# Altium integrated library BS_Altium_Lib.IntLib: 1016 symbols (part 7 of 8) (continued)
## GRM188R61C474KA93D (continued)
CAP CER 0.47UF 16V X5R 0603; Manufacturer: Murata Electronics North America; Manufacturer Part Number: GRM188R61C474KA93D; Tolerance: ±10%; Supplier 1: Digi-Key; Supplier Part Number 1: 490-11501-1-ND; RoHS: RoHS Compliant; Category: Capacitors; Stock 1: 6697; Pricing 1: 1=0.19, 10=0.131, 25=0.0964, 50=0.0788, 100=0.0666, 250=0.05428, 500=0.04554, 1000=0.04028 (USD); Packaging: Cut Tape (CT); Part Status: Active; Capacitance: 0.47µF; Voltage - Rated: 16V; Temperature Coefficient: X5R; Operating Temperature: -55°C ~ 85°C; Features: -; Ratings: -; Applications: General Purpose; Mounting Type: Surface Mount, MLCC; Size / Dimension: 0.063" L x 0.031" W (1.60mm x 0.80mm); Height - Seated (Max): -; Thickness (Max): 0.035" (0.90mm); Lead Spacing: -; Lead Style: -; ComponentLink1URL: http://www.murata.com/~/media/webrenewal/support/library/catalog/products/capacitor/mlcc/c02e.ashx; ComponentLink1Description: http://www.murata.com/~/media/webrenewal/support/library/catalog/products/capacitor/mlcc/c02e.ashx
footprint C 0603 (Chip Capacitor, 2-Leads, Body 1.6x0.8mm, IPC Medium Density)
pins: 1, 2

## GRM188R61C475KAAJD
designator C?, comment 4.7µF  Package: 0603
CAP CER 4.7UF 16V X5R 0603; Manufacturer: Murata Electronics North America; Manufacturer Part Number: GRM188R61C475KAAJD; Tolerance: ±10%; Supplier 1: Digi-Key; Supplier Part Number 1: 490-10481-1-ND; RoHS: RoHS Compliant; Category: Capacitors; Stock 1: 167381; Pricing 1: 1=0.33, 10=0.227, 25=0.182, 50=0.1516, 100=0.1289, 250=0.10236, 500=0.091, 1000=0.07962 (USD); Packaging: Cut Tape (CT); Part Status: Active; Capacitance: 4.7µF; Voltage - Rated: 16V; Temperature Coefficient: X5R; Operating Temperature: -55°C ~ 85°C; Features: Derating Recommended; Ratings: -; Applications: General Purpose; Mounting Type: Surface Mount, MLCC; Size / Dimension: 0.063" L x 0.031" W (1.60mm x 0.80mm); Height - Seated (Max): -; Thickness (Max): 0.037" (0.95mm); Lead Spacing: -; Lead Style: -; ComponentLink1URL: http://www.murata.com/~/media/webrenewal/support/library/catalog/products/capacitor/mlcc/c02e.ashx; ComponentLink1Description: http://www.murata.com/~/media/webrenewal/support/library/catalog/products/capacitor/mlcc/c02e.ashx
footprint C 0603 (Chip Capacitor, 2-Leads, Body 1.6x0.8mm, IPC Medium Density)
pins: 1, 2

## GRM188R61E105KA12D
designator C?, comment 1µF  Package: 0603
CAP CER 1UF 25V X5R 0603; Manufacturer: Murata Electronics North America; Manufacturer Part Number: GRM188R61E105KA12D; Tolerance: ±10%; Supplier 1: Digi-Key; Supplier Part Number 1: 490-3897-1-ND; RoHS: RoHS Compliant; Category: Capacitors; Stock 1: 3125603; Pricing 1: 1=0.1, 10=0.04, 25=0.0288, 50=0.0218, 100=0.0178, 250=0.01484, 500=0.01268, 1000=0.00996 (USD); Packaging: Cut Tape (CT); Part Status: Active; Capacitance: 1µF; Voltage - Rated: 25V; Temperature Coefficient: X5R; Operating Temperature: -55°C ~ 85°C; Features: -; Ratings: -; Applications: General Purpose; Mounting Type: Surface Mount, MLCC; Size / Dimension: 0.063" L x 0.031" W (1.60mm x 0.80mm); Height - Seated (Max): -; Thickness (Max): 0.035" (0.90mm); Lead Spacing: -; Lead Style: -; ComponentLink1URL: http://www.murata.com/~/media/webrenewal/support/library/catalog/products/capacitor/mlcc/c02e.ashx; ComponentLink1Description: http://www.murata.com/~/media/webrenewal/support/library/catalog/products/capacitor/mlcc/c02e.ashx
footprint C 0603 (Chip Capacitor, 2-Leads, Body 1.6x0.8mm, IPC Medium Density)
pins: 1, 2

## GRM188R61E224KA88D
designator C?, comment 0.22µF  Package: 0603
CAP CER 0.22UF 25V X5R 0603; Manufacturer: Murata Electronics North America; Manufacturer Part Number: GRM188R61E224KA88D; Tolerance: ±10%; Supplier 1: Digi-Key; Supplier Part Number 1: 490-11502-1-ND; RoHS: RoHS Compliant; Category: Capacitors; Stock 1: 3706; Pricing 1: 1=0.18, 10=0.126, 25=0.0924, 50=0.0756, 100=0.0638, 250=0.05204, 500=0.04366, 1000=0.03862 (USD); Packaging: Cut Tape (CT); Part Status: Active; Capacitance: 0.22µF; Voltage - Rated: 25V; Temperature Coefficient: X5R; Operating Temperature: -55°C ~ 85°C; Features: -; Ratings: -; Applications: General Purpose; Mounting Type: Surface Mount, MLCC; Size / Dimension: 0.063" L x 0.031" W (1.60mm x 0.80mm); Height - Seated (Max): -; Thickness (Max): 0.035" (0.90mm); Lead Spacing: -; Lead Style: -; ComponentLink1URL: http://www.murata.com/~/media/webrenewal/support/library/catalog/products/capacitor/mlcc/c02e.ashx; ComponentLink1Description: http://www.murata.com/~/media/webrenewal/support/library/catalog/products/capacitor/mlcc/c02e.ashx
footprint C 0603 (Chip Capacitor, 2-Leads, Body 1.6x0.8mm, IPC Medium Density)
pins: 1, 2

## GRM188R61E225KA12D
designator C?, comment 2.2µF  Package: 0603
CAP CER 2.2UF 25V X5R 0603; Manufacturer: Murata Electronics North America; Manufacturer Part Number: GRM188R61E225KA12D; Tolerance: ±10%; Supplier 1: Digi-Key; Supplier Part Number 1: 490-10731-1-ND; RoHS: RoHS Compliant; Category: Capacitors; Stock 1: 174226; Pricing 1: 1=0.15, 10=0.109, 25=0.08, 50=0.0622, 100=0.0515, 250=0.0426, 500=0.0361, 1000=0.02988 (USD); Packaging: Cut Tape (CT); Part Status: Active; Capacitance: 2.2µF; Voltage - Rated: 25V; Temperature Coefficient: X5R; Operating Temperature: -55°C ~ 85°C; Features: -; Ratings: -; Applications: General Purpose; Mounting Type: Surface Mount, MLCC; Size / Dimension: 0.063" L x 0.031" W (1.60mm x 0.80mm); Height - Seated (Max): -; Thickness (Max): 0.035" (0.90mm); Lead Spacing: -; Lead Style: -; ComponentLink1URL: http://www.murata.com/~/media/webrenewal/support/library/catalog/products/capacitor/mlcc/c02e.ashx; ComponentLink1Description: http://www.murata.com/~/media/webrenewal/support/library/catalog/products/capacitor/mlcc/c02e.ashx
footprint C 0603 (Chip Capacitor, 2-Leads, Body 1.6x0.8mm, IPC Medium Density)
pins: 1, 2

## GRM188R61E474KA12D
designator C?, comment 0.47µF  Package: 0603
CAP CER 0.47UF 25V X5R 0603; Manufacturer: Murata Electronics North America; Manufacturer Part Number: GRM188R61E474KA12D; Tolerance: ±10%; Supplier 1: Digi-Key; Supplier Part Number 1: 490-9728-1-ND; RoHS: RoHS Compliant; Category: Capacitors; Stock 1: 6941; Pricing 1: 1=0.22, 10=0.147, 25=0.1076, 50=0.088, 100=0.0743, 250=0.06064, 500=0.05086, 1000=0.04499 (USD); Packaging: Cut Tape (CT); Part Status: Active; Capacitance: 0.47µF; Voltage - Rated: 25V; Temperature Coefficient: X5R; Operating Temperature: -55°C ~ 85°C; Features: -; Ratings: -; Applications: General Purpose; Mounting Type: Surface Mount, MLCC; Size / Dimension: 0.063" L x 0.031" W (1.60mm x 0.80mm); Height - Seated (Max): -; Thickness (Max): 0.035" (0.90mm); Lead Spacing: -; Lead Style: -; ComponentLink1URL: http://www.murata.com/~/media/webrenewal/support/library/catalog/products/capacitor/mlcc/c02e.ashx; ComponentLink1Description: http://www.murata.com/~/media/webrenewal/support/library/catalog/products/capacitor/mlcc/c02e.ashx
footprint C 0603 (Chip Capacitor, 2-Leads, Body 1.6x0.8mm, IPC Medium Density)
pins: 1, 2

## GRM188R61E475KE11D
designator C?, comment 4.7µF  Package: 0603
CAP CER 4.7UF 25V X5R 0603; Manufacturer: Murata Electronics North America; Manufacturer Part Number: GRM188R61E475KE11D; Tolerance: ±10%; Supplier 1: Digi-Key; Supplier Part Number 1: 490-7203-1-ND; RoHS: RoHS Compliant; Category: Capacitors; Stock 1: 3914; Pricing 1: 1=0.35, 10=0.242, 25=0.198, 50=0.169, 100=0.1449, 250=0.12076, 500=0.10868, 1000=0.09177 (USD); Packaging: Cut Tape (CT); Part Status: Active; Capacitance: 4.7µF; Voltage - Rated: 25V; Temperature Coefficient: X5R; Operating Temperature: -55°C ~ 85°C; Features: -; Ratings: -; Applications: General Purpose; Mounting Type: Surface Mount, MLCC; Size / Dimension: 0.063" L x 0.031" W (1.60mm x 0.80mm); Height - Seated (Max): -; Thickness (Max): 0.031" (0.80mm); Lead Spacing: -; Lead Style: -; ComponentLink1URL: http://www.murata.com/~/media/webrenewal/support/library/catalog/products/capacitor/mlcc/c02e.ashx; ComponentLink1Description: http://www.murata.com/~/media/webrenewal/support/library/catalog/products/capacitor/mlcc/c02e.ashx
footprint C 0603 (Chip Capacitor, 2-Leads, Body 1.6x0.8mm, IPC Medium Density)
pins: 1, 2

## GRM188R71C105KE15D
designator C?, comment 1µF  Package: 0603
CAP CER 1UF 16V X7R 0603; Manufacturer: Murata Electronics North America; Manufacturer Part Number: GRM188R71C105KE15D; Tolerance: ±10%; Supplier 1: Digi-Key; Supplier Part Number 1: 490-10734-1-ND; RoHS: RoHS Compliant; Category: Capacitors; Stock 1: 149197; Pricing 1: 1=0.1, 10=0.034, 50=0.0182, 100=0.0154, 250=0.0126, 500=0.01078, 1000=0.0084 (USD); Packaging: Cut Tape (CT); Part Status: Active; Capacitance: 1µF; Voltage - Rated: 16V; Temperature Coefficient: X7R; Operating Temperature: -55°C ~ 125°C; Features: -; Ratings: -; Applications: General Purpose; Mounting Type: Surface Mount, MLCC; Size / Dimension: 0.063" L x 0.031" W (1.60mm x 0.80mm); Height - Seated (Max): -; Thickness (Max): 0.035" (0.90mm); Lead Spacing: -; Lead Style: -; ComponentLink1URL: http://www.murata.com/~/media/webrenewal/support/library/catalog/products/capacitor/mlcc/c02e.pdf; ComponentLink1Description: http://www.murata.com/~/media/webrenewal/support/library/catalog/products/capacitor/mlcc/c02e.pdf
footprint C 0603 (Chip Capacitor, 2-Leads, Body 1.6x0.8mm, IPC Medium Density)
pins: 1, 2

## GRM188R71E104KA01D
designator C?, comment 0.10µF  Package: 0603
CAP CER 0.1UF 25V X7R 0603; Manufacturer: Murata Electronics North America; Manufacturer Part Number: GRM188R71E104KA01D; Tolerance: ±10%; Supplier 1: Digi-Key; Supplier Part Number 1: 490-1524-1-ND; RoHS: RoHS Compliant; Category: Capacitors; Stock 1: 6118372; Pricing 1: 1=0.1, 10=0.019, 50=0.0104, 100=0.0088, 250=0.0072, 500=0.00616, 1000=0.0048 (USD); Packaging: Cut Tape (CT); Part Status: Active; Capacitance: 0.10µF; Voltage - Rated: 25V; Temperature Coefficient: X7R; Operating Temperature: -55°C ~ 125°C; Features: -; Ratings: -; Applications: General Purpose; Mounting Type: Surface Mount, MLCC; Size / Dimension: 0.063" L x 0.031" W (1.60mm x 0.80mm); Height - Seated (Max): -; Thickness (Max): 0.035" (0.90mm); Lead Spacing: -; Lead Style: -; ComponentLink1URL: http://www.murata.com/~/media/webrenewal/support/library/catalog/products/capacitor/mlcc/c02e.pdf; ComponentLink1Description: http://www.murata.com/~/media/webrenewal/support/library/catalog/products/capacitor/mlcc/c02e.pdf
footprint C 0603 (Chip Capacitor, 2-Leads, Body 1.6x0.8mm, IPC Medium Density)
pins: 1, 2

## GRM188R72A103KA01J
designator C?, comment 0.01 uF  Package: 0603
CAP CER 0.01UF 16V X5R 0603; Manufacturer: Murata Electronics North America; Manufacturer Part Number: GRM188R72A103KA01J; Tolerance: ±10%; Voltage - Rated: 100; Supplier 1: Digi-Key; Supplier Part Number 1: 490-12000-1-ND; RoHS: RoHS Compliant; Category: Capacitors; Stock 1: 2455; Pricing 1: 1=0.110, 10=0.090, 100=0.039, 500=0.028, 1000=0.022, 2500=0.020, 5000=0.019, 10000=0.015, 20000=0.013 (USD); Capacitance: 0.01 uF; Packaging: Cut Tape (CT); ComponentLink1URL: http://www.murata.com/~/media/webrenewal/support/library/catalog/products/capacitor/mlcc/c02e.ashx; ComponentLink1Description: http://www.murata.com/~/media/webrenewal/support/library/catalog/products/capacitor/mlcc/c02e.ashx; Applications: General Purpose; Features: -; Height - Seated (Max): -; Lead Spacing: -; Lead Style: -; Mounting Type: Surface Mount, MLCC; Operating Temperature: -55°C ~ 125°C; Part Status: Active; Ratings: -; Size / Dimension: 0.063" L x 0.031" W (1.60mm x 0.80mm); Temperature Coefficient: X5R; Thickness (Max): 0.031" (0.80mm)
footprint C 0603
pins: 1, 2

## GRM1885C1H100JA01D
designator C?, comment 10pF  Package: 0603
CAP CER 10PF 50V C0G/NP0 0603; Manufacturer: Murata Electronics North America; Manufacturer Part Number: GRM1885C1H100JA01D; Tolerance: ±5%; Temperature Coefficient: C0G, NP0; Supplier 1: Digi-Key; Supplier Part Number 1: 490-1403-1-ND; RoHS: RoHS Compliant; Category: Capacitors; Stock 1: 369990; Pricing 1: 1=0.1, 10=0.071, 100=0.0316, 500=0.0226, 1000=0.01776 (USD); Packaging: Cut Tape (CT); Part Status: Active; Voltage - Rated: 50V; Operating Temperature: -55°C ~ 125°C; Features: -; Ratings: -; Applications: General Purpose; Mounting Type: Surface Mount, MLCC; Size / Dimension: 0.063" L x 0.031" W (1.60mm x 0.80mm); Height - Seated (Max): -; Thickness (Max): 0.035" (0.90mm); Lead Spacing: -; Lead Style: -; ComponentLink1URL: http://www.murata.com/~/media/webrenewal/support/library/catalog/products/capacitor/mlcc/c02e.ashx; ComponentLink1Description: http://www.murata.com/~/media/webrenewal/support/library/catalog/products/capacitor/mlcc/c02e.ashx; Capacitance: 10pF
footprint C 0603 (Chip Capacitor, 2-Leads, Body 1.6x0.8mm, IPC Medium Density)
pins: 1, 2

## GRM1885C1H100JA01J
designator C?, comment 10pF  Package: 0603
CAP CER 10PF 50V C0G/NP0 0603; Manufacturer: Murata Electronics North America; Manufacturer Part Number: GRM1885C1H100JA01J; Tolerance: ±5%; Temperature Coefficient: C0G, NP0; Supplier 1: Digi-Key; Supplier Part Number 1: 490-11434-1-ND; RoHS: RoHS Compliant; Category: Capacitors; Stock 1: 39522; Pricing 1: 1=0.1, 10=0.071, 100=0.0316, 500=0.0226, 1000=0.01776, 2500=0.01614, 5000=0.01485 (USD); Packaging: Cut Tape (CT); Part Status: Active; Voltage - Rated: 50V; Operating Temperature: -55°C ~ 125°C; Features: -; Ratings: -; Applications: General Purpose; Mounting Type: Surface Mount, MLCC; Size / Dimension: 0.063" L x 0.031" W (1.60mm x 0.80mm); Height - Seated (Max): -; Thickness (Max): 0.035" (0.90mm); Lead Spacing: -; Lead Style: -; ComponentLink1URL: http://www.murata.com/~/media/webrenewal/support/library/catalog/products/capacitor/mlcc/c02e.ashx; ComponentLink1Description: http://www.murata.com/~/media/webrenewal/support/library/catalog/products/capacitor/mlcc/c02e.ashx; Capacitance: 10pF
footprint C 0603 (Chip Capacitor, 2-Leads, Body 1.6x0.8mm, IPC Medium Density)
pins: 1, 2

## GRM1885C1H200JA01D
designator C?, comment 20pF  Package: 0603
CAP CER 27PF 50V NP0 0603; Manufacturer: Murata Electronics North America; Manufacturer Part Number: GRM1885C1H200JA01D; Tolerance: ±5%; Temperature Coefficient: C0G, NP0; Supplier 1: Digi-Key; Supplier Part Number 1: 490-1410-2-ND; RoHS: RoHS Compliant; Category: Capacitors; Stock 1: 161874; Pricing 1: 1=0.1, 10=0.061, 50=0.0332, 100=0.0281, 250=0.02296, 500=0.01964, 1000=0.0153 (USD); Packaging: Cut Tape (CT); Part Status: Active; Capacitance: 20pF; Voltage - Rated: 50V; Operating Temperature: -55°C ~ 125°C; Features: -; Ratings: -; Applications: General Purpose; Mounting Type: Surface Mount, MLCC; Size / Dimension: 0.063" L x 0.031" W (1.60mm x 0.80mm); Height - Seated (Max): -; Thickness (Max): 0.035" (0.90mm); Lead Spacing: -; Lead Style: -; ComponentLink1URL: http://www.murata.com/~/media/webrenewal/support/library/catalog/products/capacitor/mlcc/c02e.pdf; ComponentLink1Description: http://www.murata.com/~/media/webrenewal/support/library/catalog/products/capacitor/mlcc/c02e.pdf
footprint C 0603 (Chip Capacitor, 2-Leads, Body 1.6x0.8mm, IPC Medium Density)
pins: 1, 2

## GRM1885C1H270JA01D
designator C?, comment 27pF  Package: 0603
CAP CER 27PF 50V NP0 0603; Manufacturer: Murata Electronics North America; Manufacturer Part Number: GRM1885C1H270JA01D; Tolerance: ±5%; Temperature Coefficient: C0G, NP0; Supplier 1: Digi-Key; Supplier Part Number 1: 490-1413-1-ND; RoHS: RoHS Compliant; Category: Capacitors; Stock 1: 161874; Pricing 1: 1=0.1, 10=0.061, 50=0.0332, 100=0.0281, 250=0.02296, 500=0.01964, 1000=0.0153 (USD); Packaging: Cut Tape (CT); Part Status: Active; Capacitance: 27pF; Voltage - Rated: 50V; Operating Temperature: -55°C ~ 125°C; Features: -; Ratings: -; Applications: General Purpose; Mounting Type: Surface Mount, MLCC; Size / Dimension: 0.063" L x 0.031" W (1.60mm x 0.80mm); Height - Seated (Max): -; Thickness (Max): 0.035" (0.90mm); Lead Spacing: -; Lead Style: -; ComponentLink1URL: http://www.murata.com/~/media/webrenewal/support/library/catalog/products/capacitor/mlcc/c02e.pdf; ComponentLink1Description: http://www.murata.com/~/media/webrenewal/support/library/catalog/products/capacitor/mlcc/c02e.pdf
footprint C 0603 (Chip Capacitor, 2-Leads, Body 1.6x0.8mm, IPC Medium Density)
pins: 1, 2


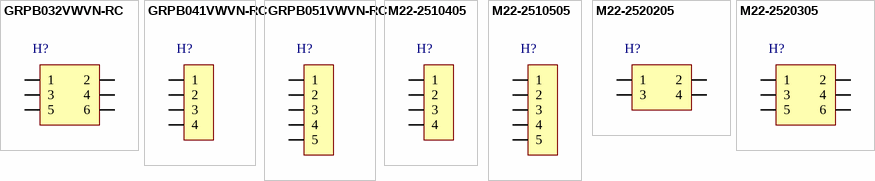
[diagram p40: symbols GRPB032VWVN-RC to M22-2520305]

## GRPB032VWVN-RC
designator H?  (value not drawn)
CONN HEADER .050" 6POS DL PCB AU; Manufacturer: Sullins Connector Solutions; Pitch - Mating: 0.050" (1.27mm); Style: Board to Board or Cable; Shrouding: Unshrouded; Number of Positions: 6; Number of Positions Loaded: All; Contact Length - Mating: 0.118" (3.00mm); Contact Length - Post: 0.091" (2.30mm); Overall Contact Length: 0.248" (6.30mm); Material Flammability Rating: UL94 V-0; Current Rating: 1A; Supplier 1: Digi-Key; Supplier Part Number 1: S9015E-03-ND; Manufacturer Part Number: GRPB032VWVN-RC; RoHS: RoHS Compliant; Category: Connectors, Interconnects; Stock 1: 14221; Pricing 1: 1=0.63, 10=0.49, 25=0.4564, 50=0.415, 100=0.3735, 250=0.3154, 500=0.2988, 1000=0.2656, 2500=0.22078 (USD); Packaging: Bulk; Part Status: Active; Connector Type: Header; Contact Type: Male Pin; Number of Rows: 2; Row Spacing - Mating: 0.050" (1.27mm); Mounting Type: Through Hole; Termination: Solder; Fastening Type: -; Insulation Height: 0.039" (1.00mm); Contact Shape: Square; Contact Finish - Mating: Gold; Contact Finish Thickness - Mating: Flash; Contact Finish - Post: Gold; Contact Material: Brass; Insulation Material: Polyamide (PA9T), Nylon 9T; Features: -; Operating Temperature: -40°C ~ 105°C; Ingress Protection: -; Insulation Color: -; Voltage Rating: -; Mated Stacking Heights: -; Contact Finish Thickness - Post: Flash; Applications: -; ComponentLink1URL: http://media.digikey.com/pdf/Data%20Sheets/Sullins%20PDFs/GRPB_%20_2VWVN-RC%2010954-C.pdf; ComponentLink1Description: http://media.digikey.com/pdf/Data%20Sheets/Sullins%20PDFs/GRPB_%20_2VWVN-RC%2010954-C.pdf
footprint HDR/3/2/MALE/50
pins: 1, 2, 3, 4, 5, 6

## GRPB041VWVN-RC
designator H?  (value not drawn)
CONN HEADER .050" 4POS PCB GOLD; Manufacturer: Sullins Connector Solutions; Pitch - Mating: 0.050" (1.27mm); Style: Board to Board or Cable; Shrouding: Unshrouded; Number of Positions: 4; Number of Positions Loaded: All; Contact Length - Mating: 0.118" (3.00mm); Contact Length - Post: 0.091" (2.30mm); Overall Contact Length: 0.248" (6.30mm); Material Flammability Rating: UL94 V-0; Current Rating: 1A; Supplier 1: Digi-Key; Supplier Part Number 1: S9014E-04-ND; Manufacturer Part Number: GRPB041VWVN-RC; RoHS: RoHS Compliant; Category: Connectors, Interconnects; Stock 1: 29276; Pricing 1: 1=0.56, 10=0.389, 25=0.3332, 50=0.2998, 100=0.2609, 250=0.222, 500=0.2109, 1000=0.1887, 2500=0.14985 (USD); Packaging: Bulk; Part Status: Active; Connector Type: Header; Contact Type: Male Pin; Number of Rows: 1; Row Spacing - Mating: -; Mounting Type: Through Hole; Termination: Solder; Fastening Type: -; Insulation Height: 0.039" (1.00mm); Contact Shape: Square; Contact Finish - Mating: Gold; Contact Finish Thickness - Mating: Flash; Contact Finish - Post: Gold; Contact Material: Brass; Insulation Material: Polyamide (PA9T), Nylon 9T; Features: -; Operating Temperature: -40°C ~ 105°C; Ingress Protection: -; Insulation Color: -; Voltage Rating: -; Mated Stacking Heights: -; Contact Finish Thickness - Post: Flash; Applications: -; ComponentLink1URL: http://www.sullinscorp.com/drawings/71_GRPB___1VWVN-RC,_10957-C.pdf; ComponentLink1Description: http://www.sullinscorp.com/drawings/71_GRPB___1VWVN-RC,_10957-C.pdf
footprint HDR/4x1/MALE/50
pins: 1, 2, 3, 4

## GRPB051VWVN-RC
designator H?  (value not drawn)
CONN HEADER .050" 5POS PCB GOLD; Manufacturer: Sullins Connector Solutions; Pitch - Mating: 0.050" (1.27mm); Style: Board to Board or Cable; Shrouding: Unshrouded; Number of Positions: 5; Number of Positions Loaded: All; Contact Length - Mating: 0.118" (3.00mm); Contact Length - Post: 0.091" (2.30mm); Overall Contact Length: 0.248" (6.30mm); Material Flammability Rating: UL94 V-0; Current Rating: 1A; Supplier 1: Digi-Key; Supplier Part Number 1: S9014E-05-ND; Manufacturer Part Number: GRPB051VWVN-RC; RoHS: RoHS Compliant; Category: Connectors, Interconnects; Stock 1: 17300; Pricing 1: 1=0.52, 10=0.407, 25=0.3796, 50=0.345, 100=0.3105, 250=0.2622, 500=0.2484, 1000=0.2208, 2500=0.18354 (USD); Packaging: Bulk; Part Status: Active; Connector Type: Header; Contact Type: Male Pin; Number of Rows: 1; Row Spacing - Mating: -; Mounting Type: Through Hole; Termination: Solder; Fastening Type: -; Insulation Height: 0.039" (1.00mm); Contact Shape: Square; Contact Finish - Mating: Gold; Contact Finish Thickness - Mating: Flash; Contact Finish - Post: Gold; Contact Material: Brass; Insulation Material: Polyamide (PA9T), Nylon 9T; Features: -; Operating Temperature: -40°C ~ 105°C; Ingress Protection: -; Insulation Color: -; Voltage Rating: -; Mated Stacking Heights: -; Contact Finish Thickness - Post: Flash; Applications: -; ComponentLink1URL: http://www.sullinscorp.com/drawings/71_GRPB___1VWVN-RC,_10957-C.pdf; ComponentLink1Description: http://www.sullinscorp.com/drawings/71_GRPB___1VWVN-RC,_10957-C.pdf
footprint HDR/5x1/MALE/50
pins: 1, 2, 3, 4, 5

## M22-2510405
designator H?  (value not drawn)
CONN HEADER 2MM VERT AU 4POS; Manufacturer: Harwin Inc.; Connector Type: Header, Cuttable; Pitch - Mating: 0.079" (2.00mm); Style: Board to Board; Shrouding: Unshrouded; Number of Positions: 4; Number of Positions Loaded: All; Contact Length - Mating: 0.138" (3.50mm); Contact Length - Post: 0.091" (2.30mm); Overall Contact Length: 0.287" (7.30mm); Material Flammability Rating: UL94 V-0; Current Rating: 1A per Contact; Mated Stacking Heights: 5.9mm, 8.6mm; Supplier 1: Digi-Key; Supplier Part Number 1: 952-1313-ND; Manufacturer Part Number: M22-2510405; RoHS: RoHS Compliant; Category: Connectors, Interconnects; Stock 1: 16900; Pricing 1: 1=0.29, 10=0.273, 100=0.1911, 500=0.1638, 1000=0.1365, 5000=0.117, 10000=0.1092 (USD); Packaging: Bulk; Part Status: Active; Contact Type: Male Pin; Number of Rows: 1; Row Spacing - Mating: -; Mounting Type: Through Hole; Termination: Solder; Fastening Type: -; Insulation Height: 0.060" (1.50mm); Contact Shape: Square; Contact Finish - Mating: Gold; Contact Finish Thickness - Mating: -; Contact Finish - Post: -; Contact Material: Phosphor Bronze; Insulation Material: Polyamide (PA6T), Nylon 6T; Features: -; Operating Temperature: -40°C ~ 105°C; Ingress Protection: -; Insulation Color: Black; Voltage Rating: -; Contact Finish Thickness - Post: -; Applications: -; ComponentLink1URL: https://cdn.harwin.com/pdfs/M22-251.pdf; ComponentLink1Description: https://cdn.harwin.com/pdfs/M22-251.pdf
footprint HDR/4x1/MALE/2.0
pins: 1, 2, 3, 4

## M22-2510505
designator H?  (value not drawn)
CONN HEADER 2MM VERT AU 5POS; Manufacturer: Harwin Inc.; Connector Type: Header, Cuttable; Pitch - Mating: 0.079" (2.00mm); Style: Board to Board; Shrouding: Unshrouded; Number of Positions: 5; Number of Positions Loaded: All; Contact Length - Mating: 0.138" (3.50mm); Contact Length - Post: 0.091" (2.30mm); Overall Contact Length: 0.287" (7.30mm); Material Flammability Rating: UL94 V-0; Current Rating: 1A per Contact; Mated Stacking Heights: 5.9mm, 8.6mm; Supplier 1: Digi-Key; Supplier Part Number 1: 952-1314-ND; Manufacturer Part Number: M22-2510505; RoHS: RoHS Compliant; Category: Connectors, Interconnects; Stock 1: 3876; Pricing 1: 1=0.36, 10=0.336, 100=0.2352, 500=0.2016, 1000=0.168, 5000=0.144, 10000=0.1344 (USD); Packaging: Bulk; Part Status: Active; Contact Type: Male Pin; Number of Rows: 1; Row Spacing - Mating: -; Mounting Type: Through Hole; Termination: Solder; Fastening Type: -; Insulation Height: 0.060" (1.50mm); Contact Shape: Square; Contact Finish - Mating: Gold; Contact Finish Thickness - Mating: -; Contact Finish - Post: -; Contact Material: Phosphor Bronze; Insulation Material: Polyamide (PA6T), Nylon 6T; Features: -; Operating Temperature: -40°C ~ 105°C; Ingress Protection: -; Insulation Color: Black; Voltage Rating: -; Contact Finish Thickness - Post: -; Applications: -; ComponentLink1URL: https://cdn.harwin.com/pdfs/M22-251.pdf; ComponentLink1Description: https://cdn.harwin.com/pdfs/M22-251.pdf
footprint HDR/5x1/MALE/2.0
pins: 1, 2, 3, 4, 5

## M22-2520205
designator H?  (value not drawn)
CONN HEADER 2MM VERT AU 4POS; Manufacturer: Harwin Inc.; Connector Type: Header, Cuttable; Pitch - Mating: 0.079" (2.00mm); Style: Board to Board; Shrouding: Unshrouded; Number of Positions: 4; Number of Positions Loaded: All; Contact Length - Mating: 0.138" (3.50mm); Contact Length - Post: 0.091" (2.30mm); Overall Contact Length: 0.287" (7.30mm); Material Flammability Rating: UL94 V-0; Current Rating: 1A per Contact; Mated Stacking Heights: 3.8mm, 5.9mm, 8.6mm; Supplier 1: Digi-Key; Supplier Part Number 1: 952-1317-ND; Manufacturer Part Number: M22-2520205; RoHS: RoHS Compliant; Category: Connectors, Interconnects; Stock 1: 4672; Pricing 1: 1=0.34, 10=0.326, 100=0.2279, 500=0.1953, 1000=0.16275, 5000=0.1395, 10000=0.1302 (USD); Packaging: Bulk; Part Status: Active; Contact Type: Male Pin; Number of Rows: 2; Row Spacing - Mating: 0.079" (2.00mm); Mounting Type: Through Hole; Termination: Solder; Fastening Type: -; Insulation Height: 0.060" (1.50mm); Contact Shape: Square; Contact Finish - Mating: Gold; Contact Finish Thickness - Mating: -; Contact Finish - Post: -; Contact Material: Phosphor Bronze; Insulation Material: Polyamide (PA6T), Nylon 6T; Features: -; Operating Temperature: -40°C ~ 105°C; Ingress Protection: -; Insulation Color: Black; Voltage Rating: -; Contact Finish Thickness - Post: -; Applications: -; ComponentLink1URL: https://cdn.harwin.com/pdfs/M22-252.pdf; ComponentLink1Description: https://cdn.harwin.com/pdfs/M22-252.pdf
footprint HDR/2/2/MALE/2.0
pins: 1, 2, 3, 4

## M22-2520305
designator H?  (value not drawn)
CONN HEADER 2MM VERT AU 6POS; Manufacturer: Harwin Inc.; Connector Type: Header, Cuttable; Pitch - Mating: 0.079" (2.00mm); Style: Board to Board; Shrouding: Unshrouded; Number of Positions: 6; Number of Positions Loaded: All; Contact Length - Mating: 0.138" (3.50mm); Contact Length - Post: 0.091" (2.30mm); Overall Contact Length: 0.287" (7.30mm); Material Flammability Rating: UL94 V-0; Current Rating: 1A per Contact; Mated Stacking Heights: 3.8mm, 5.9mm, 8.6mm; Supplier 1: Digi-Key; Supplier Part Number 1: 952-1318-ND; Manufacturer Part Number: M22-2520305; RoHS: RoHS Compliant; Category: Connectors, Interconnects; Stock 1: 6280; Pricing 1: 1=0.43, 10=0.41, 100=0.2867, 500=0.2457, 1000=0.20475, 5000=0.1755, 10000=0.1638 (USD); Packaging: Bulk; Part Status: Active; Contact Type: Male Pin; Number of Rows: 2; Row Spacing - Mating: 0.079" (2.00mm); Mounting Type: Through Hole; Termination: Solder; Fastening Type: -; Insulation Height: 0.060" (1.50mm); Contact Shape: Square; Contact Finish - Mating: Gold; Contact Finish Thickness - Mating: -; Contact Finish - Post: -; Contact Material: Phosphor Bronze; Insulation Material: Polyamide (PA6T), Nylon 6T; Features: -; Operating Temperature: -40°C ~ 105°C; Ingress Protection: -; Insulation Color: Black; Voltage Rating: -; Contact Finish Thickness - Post: -; Applications: -; ComponentLink1URL: https://cdn.harwin.com/pdfs/M22-252.pdf; ComponentLink1Description: https://cdn.harwin.com/pdfs/M22-252.pdf
footprint HDR/3/2/MALE/2.0
pins: 1, 2, 3, 4, 5, 6


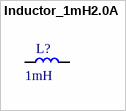
[diagram p41: symbol Inductor_1mH2.0A]

## Inductor_1mH2.0A
designator L?, comment 1mH
Fixed Inductors 1mH 2.0A
footprint CYLN/D100/H125/LS50/Inductor (Dia 10mm, Heigh 12.5mm, Lead Space 5.0mm)
pins: 1, 2


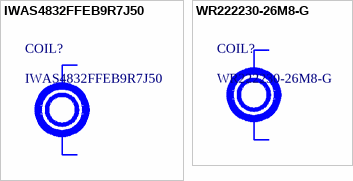
[diagram p42: symbols IWAS4832FFEB9R7J50 to WR222230-26M8-G]

## IWAS4832FFEB9R7J50
designator COIL?
RX 1 COIL 1 LAYER BIFILAR 9.7UH; Manufacturer: Vishay Dale; Function: Receiver; Inductance: 9.7µH; Tolerance: ±5%; DC Resistance (DCR): 200 mOhm; Q @ Freq: 30 @ 200kHz; Supplier 1: Digi-Key; Supplier Part Number 1: 541-1409-ND; Manufacturer Part Number: IWAS4832FFEB9R7J50; RoHS: RoHS Compliant; Category: Inductors, Coils, Chokes; Stock 1: 2937; Pricing 1: 1=4.44, 10=4.07, 25=3.7, 50=3.108, 100=2.664, 250=2.516, 500=2.368, 1000=2.22 (USD); Part Status: Active; Type: 1 Coil, 1 Layer, Bifilar; Current Rating: -; Current - Saturation: -; Frequency - Self Resonant: -; Operating Temperature: -; Size / Dimension: 1.89" L x 1.26" W x 0.04" H (48.0mm x 32.0mm x 1.1mm); ComponentLink1URL: http://www.vishay.com/docs/34311/iwas4832.pdf; ComponentLink1Description: http://www.vishay.com/docs/34311/iwas4832.pdf
footprint COIL IWAS-4832FF-50

## WR222230-26M8-G
designator COIL?
RX 1 COIL 1 LAYER 27UH; Manufacturer: TDK Corporation; Function: Receiver; Inductance: 27µH; DC Resistance (DCR): 1.1 Ohm Max; Supplier 1: Digi-Key; Supplier Part Number 1: 445-173093-ND; Manufacturer Part Number: WR222230-26M8-G; RoHS: RoHS Compliant; Category: Inductors, Coils, Chokes; Stock 1: 453; Pricing 1: 1=5.34, 10=4.895, 25=4.45, 50=3.738, 100=3.204, 250=3.026, 500=2.848, 1000=2.67 (USD); Part Status: Active; Type: 1 Coil, 1 Layer; Tolerance: -; Q @ Freq: -; Current Rating: -; Current - Saturation: -; Frequency - Self Resonant: -; Operating Temperature: -; ComponentLink1URL: https://product.tdk.com/info/en/catalog/datasheets/wlc_rx_wr222230-26m8-g_en.pdf; ComponentLink1Description: https://product.tdk.com/info/en/catalog/datasheets/wlc_rx_wr222230-26m8-g_en.pdf
footprint COIL WR222230-26M8-G


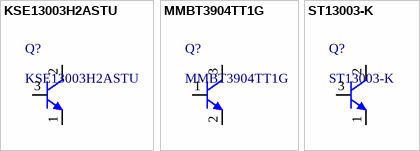
[diagram p43: symbols KSE13003H2ASTU to ST13003-K]

## KSE13003H2ASTU
designator Q?
TRANS NPN 400V 1.5A TO126; Manufacturer: Fairchild Semiconductor; Vce Saturation (Max) @ Ib, Ic: 3V @ 500mA, 1.5A; DC Current Gain (hFE) (Min) @ Ic, Vce: 14 @ 500mA, 2V; Power - Max: 20W; Frequency - Transition: 4MHz; Collector- Base Voltage VCBO: 700 V; Configuration: Single; DC Current Gain hFE Max: 40; Emitter- Base Voltage VEBO: 9 V; Collector-Emitter Saturation Voltage: 0.5 V; DC Collector/Base Gain hfe Min: 8; Gain Bandwidth Product fT: 4 MHz; Pd - Power Dissipation: 20 W; Supplier 1: Digi-Key; Supplier Part Number 1: KSE13003H2ASTU-ND; Manufacturer Part Number: KSE13003H2ASTU; RoHS: RoHS Compliant; Category: Discrete Semiconductor Products; Stock 1: 1691; Pricing 1: 1=0.44, 10=0.373, 100=0.2786, 500=0.2189, 1000=0.16915 (USD); Packaging: Tube; Part Status: Active; Transistor Type: NPN; Current - Collector (Ic) (Max): 1.5A; Voltage - Collector Emitter Breakdown (Max): 400V; Current - Collector Cutoff (Max): -; Operating Temperature: 150°C (TJ); Mounting Type: Through Hole; Package / Case: TO-225AA, TO-126-3; Supplier Device Package: TO-126-3; ComponentLink1URL: https://www.fairchildsemi.com/datasheets/KS/KSE13003.pdf; ComponentLink1Description: https://www.fairchildsemi.com/datasheets/KS/KSE13003.pdf; Supplier 2: Mouser; Supplier Part Number 2: 512-KSE13003H2ASTU; Stock 2: 1305; Pricing 2: 1=0.430, 10=0.359, 100=0.219, 1000=0.169, 2500=0.144, 10000=0.134, 25000=0.127, 50000=0.121, 100000=0.118 (USD); Collector- Emitter Voltage VCEO Max: 400 V; Height: 11 mm; Length: 8 mm; Series: KSE13003; Width: 3.25 mm; Brand: Fairchild Semiconductor; Continuous Collector Current: 1.5 A; Mounting Style: Through Hole; Transistor Polarity: NPN; Maximum DC Collector Current: 1.5 A; Maximum Operating Temperature: + 150 C; Minimum Operating Temperature: - 65 C; Standard Pack Qty: 1920; RoHS - Mouser: Y; Minimum Order Quantity: 1; Reeling: False; ComponentLink2URL: http://www.mouser.com/ds/2/149/KSE13003-889466.pdf; ComponentLink2Description: http://www.mouser.com/ds/2/149/KSE13003-889466.pdf
footprint TO-126
pins: 1 E, 2 C, 3 B

## MMBT3904TT1G
designator Q?
TRANS NPN 40V 0.2A SOT416; Manufacturer: ON Semiconductor; Current - Collector (Ic) (Max): 200mA; Vce Saturation (Max) @ Ib, Ic: 300mV @ 5mA, 50mA; DC Current Gain (hFE) (Min) @ Ic, Vce: 100 @ 10mA, 1V; Power - Max: 300mW; Frequency - Transition: 300MHz; Supplier 1: Digi-Key; RoHS: RoHS Compliant; Category: Discrete Semiconductor Products; Stock 1: 29372; Pricing 1: 1=0.15, 10=0.137, 100=0.0744, 500=0.0458, 1000=0.03123 (USD); Packaging: Cut Tape (CT); Part Status: Active; Transistor Type: NPN; Voltage - Collector Emitter Breakdown (Max): 40V; Current - Collector Cutoff (Max): -; Operating Temperature: -55°C ~ 150°C (TJ); Mounting Type: Surface Mount; Package / Case: SC-75, SOT-416; Supplier Device Package: SC-75, SOT-416; ComponentLink1URL: http://www.onsemi.com/pub_link/Collateral/MMBT3904TT1-D.PDF; ComponentLink1Description: http://www.onsemi.com/pub_link/Collateral/MMBT3904TT1-D.PDF; Supplier Part Number 1: MMBT3904TT1GOSCT-ND; Manufacturer Part Number: MMBT3904TT1G
footprint SOT-416
pins: 1 B, 2 E, 3 C

## ST13003-K
designator Q?
TRANS NPN 400V 1.5A SOT-32; Manufacturer: STMicroelectronics; Vce Saturation (Max) @ Ib, Ic: 1.5V @ 500mA, 1.5A; Current - Collector Cutoff (Max): 1mA; DC Current Gain (hFE) (Min) @ Ic, Vce: 5 @ 1A, 2V; Power - Max: 40W; Configuration: Single; DC Current Gain hFE Max: 8; Emitter- Base Voltage VEBO: 9 V; Pd - Power Dissipation: 40000 mW; Supplier 1: Digi-Key; Manufacturer Part Number: ST13003-K; RoHS: RoHS Compliant; Category: Discrete Semiconductor Products; Stock 1: 2233; Pricing 1: 1=0.67, 10=0.591, 100=0.4529, 500=0.358, 1000=0.2864 (USD); Packaging: Bulk; Part Status: Active; Transistor Type: NPN; Current - Collector (Ic) (Max): 1.5A; Voltage - Collector Emitter Breakdown (Max): 400V; Frequency - Transition: -; Operating Temperature: -40°C ~ 150°C (TJ); Mounting Type: Through Hole; Package / Case: TO-225AA, TO-126-3; Supplier Device Package: SOT-32-3; ComponentLink1URL: http://www.st.com/web/en/resource/technical/document/datasheet/CD00160678.pdf; ComponentLink1Description: http://www.st.com/web/en/resource/technical/document/datasheet/CD00160678.pdf; Supplier 2: Mouser; Stock 2: 644; Pricing 2: 1=0.660, 10=0.555, 100=0.358, 1000=0.286, 2000=0.242, 5000=0.233, 10000=0.232, 25000=0.218, 50000=0.214 (USD); Collector- Emitter Voltage VCEO Max: 400 V; Height: 10.8 mm (Max); Length: 7.8 mm (Max); Series: 500V to 1000V Transistors; Width: 2.7 mm (Max); Brand: STMicroelectronics; Mounting Style: SMD/SMT; Transistor Polarity: NPN; DC Collector/Base Gain hfe Min: 8; Maximum DC Collector Current: 1.5 A; Maximum Operating Temperature: + 150 C; Minimum Operating Temperature: - 55 C; Standard Pack Qty: 500; RoHS - Mouser: Y; Minimum Order Quantity: 1; Reeling: False; ComponentLink2URL: http://www.mouser.com/ds/2/389/st13003-955232.pdf; ComponentLink2Description: http://www.mouser.com/ds/2/389/st13003-955232.pdf; Supplier Part Number 1: 497-10295-ND; Supplier Part Number 2: 511-ST13003-K
footprint TO-126
pins: 1 E, 2 C, 3 B


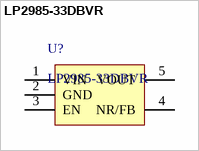
[diagram p44: symbol LP2985-33DBVR]

## LP2985-33DBVR
designator U?
IC REG LDO 3.3V 0.15A SOT23-5; Manufacturer: Texas Instruments; Regulator Topology: Positive Fixed; Current - Output: 150mA; Voltage - Dropout (Typical): 0.28V @ 150mA; Number of Regulators: 1; Voltage - Input: Up to 16V; Input Voltage MAX: 16 V; Number of Outputs: 1 Output; Output Current: 150 mA; Output Type: Fixed; Dropout Voltage - Max: 3 mV at 0 A; Voltage Regulation Accuracy: 1.5 %; Dropout Voltage: 0.001 V at 0 A; Ib - Input Bias Current: 850 uA; Input Voltage MIN: + 2.2 V; Line Regulation: 0.014 % / V; Polarity: Positive; Supplier 1: Digi-Key; Supplier Part Number 1: 296-18476-1-ND; Manufacturer Part Number: LP2985-33DBVR; RoHS: RoHS Compliant; Category: Integrated Circuits (ICs); Stock 1: 68988; Pricing 1: 1=0.58, 10=0.51, 100=0.39, 500=0.309, 1000=0.2475 (USD); Packaging: Cut Tape (CT); Part Status: Active; Voltage - Output: 3.3V; Current - Limit (Min): -; Operating Temperature: -40°C ~ 125°C; Mounting Type: Surface Mount; Package / Case: SC-74A, SOT-753; Supplier Device Package: SOT-23-5; ComponentLink1URL: http://www.ti.com/lit/ds/symlink/lp2985-18.pdf; ComponentLink1Description: http://www.ti.com/lit/ds/symlink/lp2985-18.pdf; Supplier 2: Mouser; Supplier Part Number 2: 595-LP2985-33DBVR; Stock 2: 19872; Pricing 2: 1=0.550, 10=0.465, 100=0.300, 1000=0.240, 2000=0.203, 3000=0.202, 9000=0.194, 24000=0.187, 48000=0.180 (USD); Height: 1.15 mm; Length: 2.9 mm; Output Voltage: 3.3 V; Series: LP2985-33; Width: 1.6 mm; Brand: Texas Instruments; Mounting Style: SMD/SMT; Maximum Operating Temperature: + 125 C; Minimum Operating Temperature: - 40 C; Standard Pack Qty: 3000; RoHS - Mouser: Y; Minimum Order Quantity: 1; Reeling: True
footprint SOT-23-5 (SOT23, 5-Leads, Body 3.0x3.0mm (max), Pitch 0.95mm, IPC Medium Density)
pins: 1 VIN, 2 GND, 3 EN, 4 NR/FB, 5 VOUT


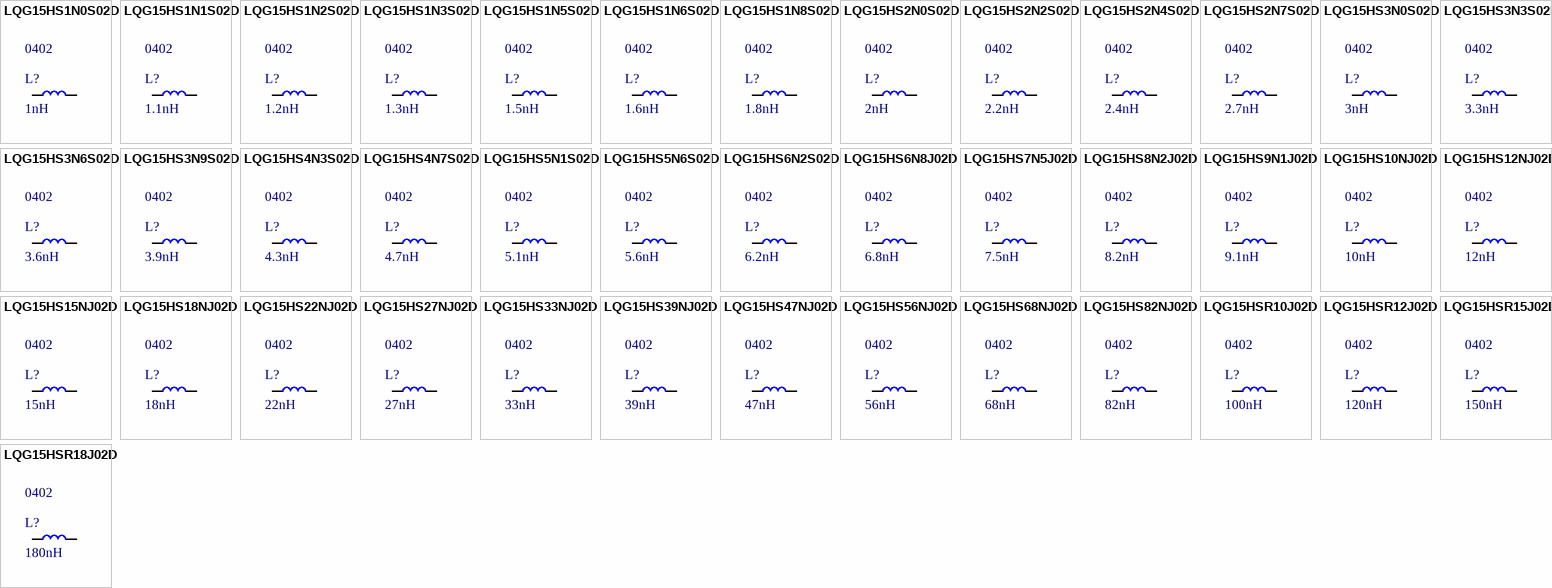
[diagram p45: symbols LQG15HS1N0S02D to LQG15HSR18J02D]

## LQG15HS1N0S02D
designator L?, comment 1nH  Package / Case: 0402
FIXED IND 1NH 1A 70 MOHM SMD; Manufacturer: Murata Electronics North America; Manufacturer Part Number: LQG15HS1N0S02D; Type: Multilayer; Tolerance: ±0.3nH; Shielding: Unshielded; DC Resistance (DCR): 70 mOhm Max; Q @ Freq: 8 @ 100MHz; Frequency - Self Resonant: 10GHz; Frequency - Test: 100MHz; Supplier 1: Digi-Key; RoHS: RoHS Compliant; Category: Inductors, Coils, Chokes; Stock 1: 71998; Pricing 1: 1=0.1, 10=0.059, 25=0.0528, 50=0.0456, 100=0.041, 250=0.03804, 500=0.0351, 750=0.03335, 1000=0.03042 (USD); Packaging: Cut Tape (CT); Part Status: Active; Material - Core: -; Inductance: 1nH; Current Rating: 1A; Current - Saturation: -; Ratings: -; Operating Temperature: -55°C ~ 125°C; Mounting Type: Surface Mount; Supplier Device Package: 0402 (1005 Metric); Size / Dimension: 0.039" L x 0.020" W (1.00mm x 0.50mm); Height - Seated (Max): 0.022" (0.55mm); ComponentLink1URL: http://psearch.en.murata.com/inductor/product/LQG15HS1N0S02_.pdf; ComponentLink1Description: http://psearch.en.murata.com/inductor/product/LQG15HS1N0S02_.pdf; Supplier Part Number 1: 490-2610-1-ND
footprint L 0402 (1005) (Chip Capacitor, 2-Leads, Body 1.0x0.5mm, IPC Medium Density)
pins: 1, 2

## LQG15HS1N1S02D
designator L?, comment 1.1nH  Package / Case: 0402
FIXED IND 1.1NH 1A 90 MOHM; Manufacturer: Murata Electronics North America; Manufacturer Part Number: LQG15HS1N1S02D; Type: Multilayer; Tolerance: ±0.3nH; Shielding: Unshielded; DC Resistance (DCR): 90 mOhm Max; Q @ Freq: 8 @ 100MHz; Frequency - Self Resonant: 6GHz; Frequency - Test: 100MHz; Supplier 1: Digi-Key; RoHS: RoHS Compliant; Category: Inductors, Coils, Chokes; Stock 1: 23731; Pricing 1: 1=0.1, 10=0.059, 25=0.0528, 50=0.0456, 100=0.041, 250=0.03804, 500=0.0351, 750=0.03335, 1000=0.03042 (USD); Packaging: Cut Tape (CT); Part Status: Active; Material - Core: -; Inductance: 1.1nH; Current Rating: 1A; Current - Saturation: -; Ratings: -; Operating Temperature: -55°C ~ 125°C; Mounting Type: Surface Mount; Supplier Device Package: 0402 (1005 Metric); Size / Dimension: 0.039" L x 0.020" W (1.00mm x 0.50mm); Height - Seated (Max): 0.022" (0.55mm); ComponentLink1URL: http://psearch.en.murata.com/inductor/product/LQG15HS1N1S02_.pdf; ComponentLink1Description: http://psearch.en.murata.com/inductor/product/LQG15HS1N1S02_.pdf; Supplier Part Number 1: 490-6567-1-ND
footprint L 0402 (1005) (Chip Capacitor, 2-Leads, Body 1.0x0.5mm, IPC Medium Density)
pins: 1, 2

## LQG15HS1N2S02D
designator L?, comment 1.2nH  Package / Case: 0402